# Altium footprint library CMR_Connectors.PcbLib: 71 footprints (part 1 of 5)
Each footprint in its own frame and in the unit in brackets; x right, y up, seen from the top. Pads: shape width x height; smd on the part's side, far side on the other; paste and mask are expansions set on the pad; w line width, h text height; cw(c..) or ccw(c..) is an arc to the next point about the centre after c.
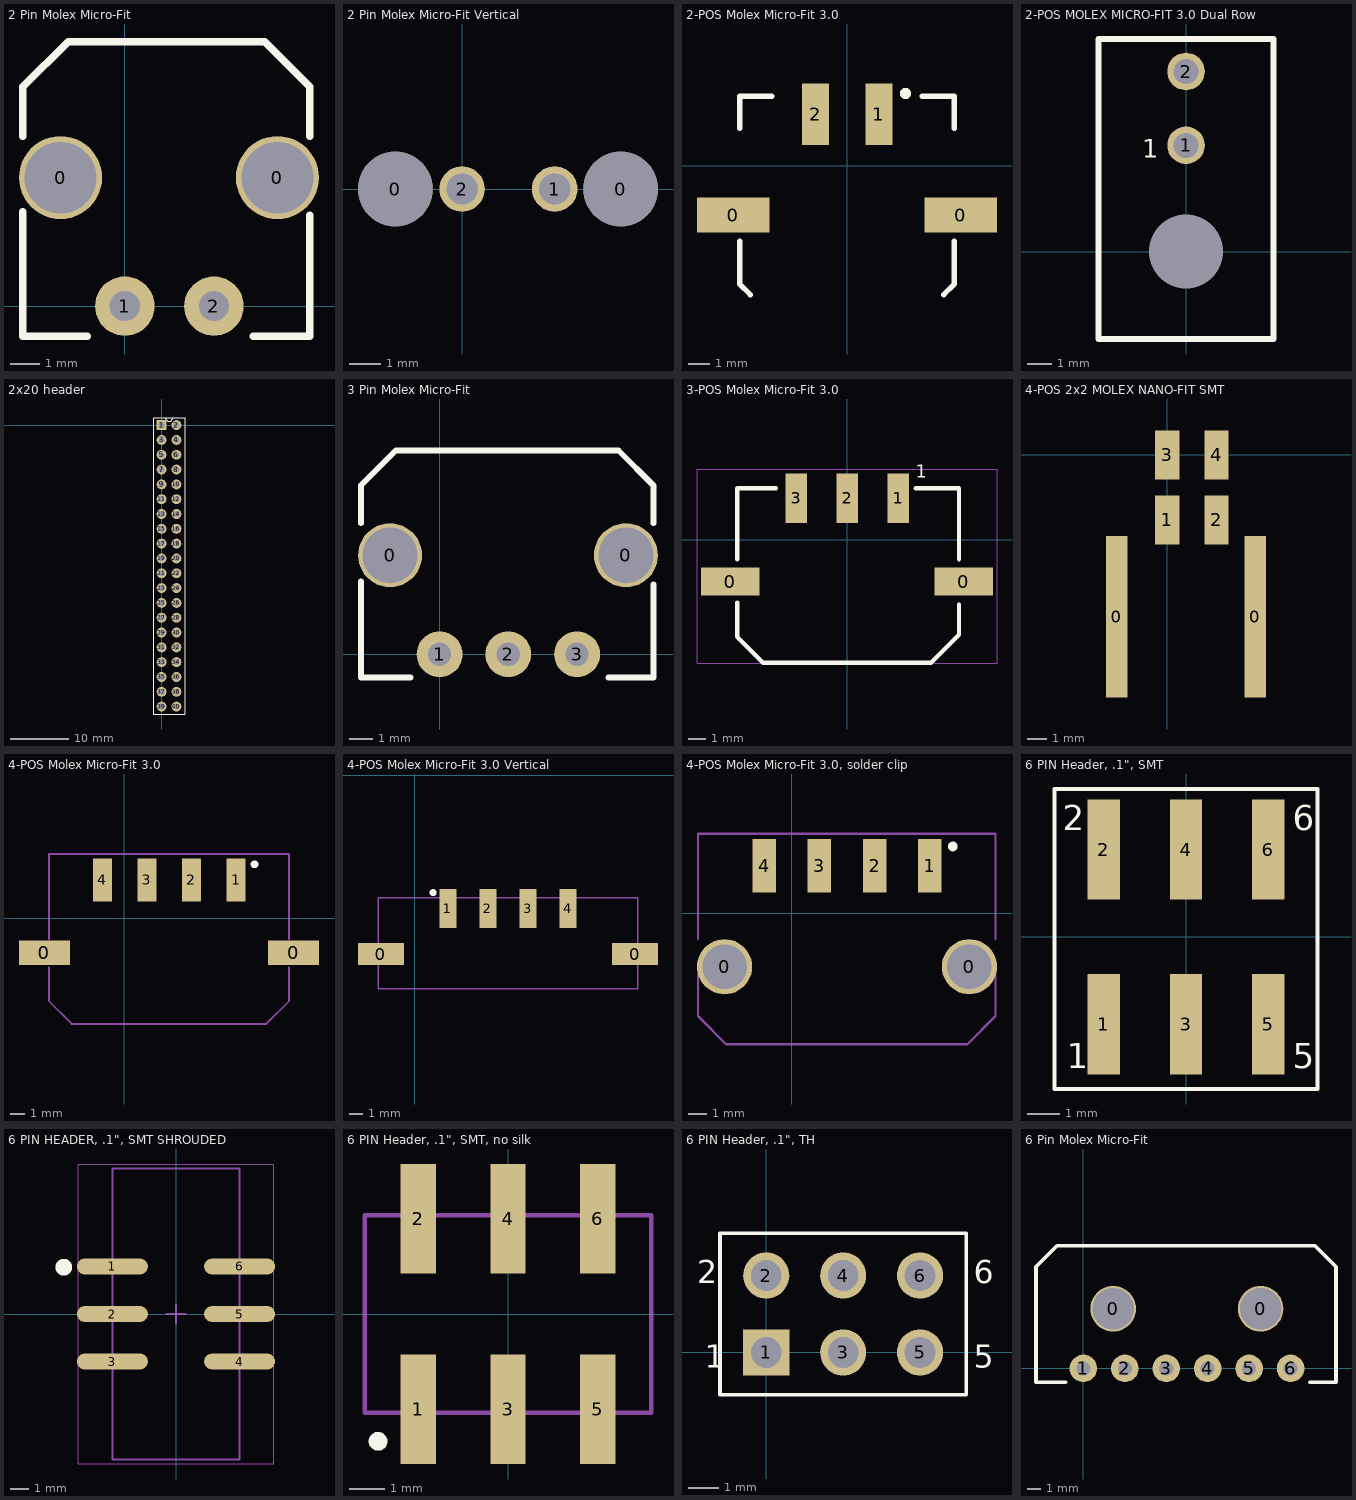
[diagram p0: the footprints below, top view; thin cyan lines are the x and y axes]

## 2 Pin Molex Micro-Fit [mil] "2 Pin Molex Micro-Fit"
pads (4):
  round 110 hole 95: 0(-85,170) 0(202,170)
  round 78.74 hole 40: 1(0,0) 2(118,0)
Top Overlay:
  lines w10: -135,125 -135,-40 -50,-40 ; -135,225 -135,290 -75,350 185,350 245,290 245,225 ; 170,-40 245,-40 245,120
3D body "436500203.stp": height 218.43, standoff -127.44, extent -132.96,-38.88 246.96,350.88
3D body "436450200.stp": height 274.02, standoff -8.66, extent -106.1,357.28 220.28,908.46

## 2 Pin Molex Micro-Fit Vertical [mil] "2 Pin Molex Micro-Fit Vertical"
pads (4):
  round 95 hole 95 unplated: 0(-85,0) 0(202,0)
  round 58 hole 40: 1(118,0) 2(0,0)
3D body "436500218.stp": height 389.88, standoff -125.08, extent -130.95,-96.24 248.97,124.43
3D body "436450200.stp": height 942.91, standoff 391.73, extent -104.19,-103 222.19,176.53

## 2-POS Molex Micro-Fit 3.0 [mil] "2-POS SMT HEADER, Molex Micro-Fit 3.0"
height 345
pads (4):
  rect 135x65 smd mask+3: 0(-212,-91.5) 0(212,-91.5)
  rect 50x115 smd mask+3: 1(59.5,96.5) 2(-58.5,96.5)
Top Overlay:
  circle w10: c109,135 r5.39
  lines w10: -200,-140 -200,-220 -180,-240 ; -200,70 -200,130 -140,130 ; 140,130 200,130 200,70 ; 180,-240 200,-220 200,-140
3D body "436450200.stp": height 275.59, standoff -3.94, extent -163.98,-831.69 162.4,-280.51
3D body "436500212.stp": height 223.43, standoff 0, extent -268.69,-274.88 268.71,147.96

## 2-POS MOLEX MICRO-FIT 3.0 Dual Row [mil] "2-POS TH Dual Row HEADER, Molex Micro-Fit 3.0"
height 345
pads (3):
  round 0 hole 118 unplated: 0(0,0)
  round 60 hole 40: 1(0,170) 2(0,288)
Top Overlay:
  lines w10: -140,-140 140,-140 140,340 -140,340 -140,-140
  text "1" at -70,150 h30
3D body "430250200.stp": height 421.65, standoff -5.51, extent -104.92,-733.27 102.95,-182.09
3D body "430450200.stp": height 346.35, standoff -124.12, extent -140.75,-179.88 140.75,302.01

## 2x20 header [mm]
pads (40):
  rect 1.7x1.7 hole 1.02: 1(0,0)
  round 1.7 hole 1.02: 2(2.54,0) 3(0,-2.54) 4(2.54,-2.54) 5(0,-5.08) 6(2.54,-5.08) 7(0,-7.62) 8(2.54,-7.62) 9(0,-10.16) 10(2.54,-10.16) 11(0,-12.7) 12(2.54,-12.7) 13(0,-15.24) 14(2.54,-15.24) 15(0,-17.78) 16(2.54,-17.78) 17(0,-20.32) 18(2.54,-20.32) 19(0,-22.86) 20(2.54,-22.86) 21(0,-25.4) 22(2.54,-25.4) 23(0,-27.94) 24(2.54,-27.94) 25(0,-30.48) 26(2.54,-30.48) 27(0,-33.02) 28(2.54,-33.02) 29(0,-35.56) 30(2.54,-35.56) 31(0,-38.1) 32(2.54,-38.1) 33(0,-40.64) 34(2.54,-40.64) 35(0,-43.18) 36(2.54,-43.18) 37(0,-45.72) 38(2.54,-45.72) 39(0,-48.26) 40(2.54,-48.26)
Top Overlay:
  lines w0.2: -1.4,-49.53 -1.4,1.27 1.905,1.27 cw(c1.27,1.27) 0.635,1.27 3.925,1.27 3.925,-49.53 -1.4,-49.53

## 3 Pin Molex Micro-Fit [mil] "3 Pin Molex Micro-Fit"
pads (5):
  round 110 hole 95: 0(-85,170) 0(320,170)
  round 78.74 hole 40: 1(0,0) 2(118,0) 3(236.11,0)
Top Overlay:
  lines w10: -135,125 -135,-40 -50,-40 ; -135,225 -135,290 -75,350 307.05,350 367.05,290 367.05,225 ; 290,-40 365,-40 ; 367.05,-40 367.05,120
3D body "436450300.stp": height 274.02, standoff -9.84, extent -74.8,354.33 312.99,905.51
3D body "436500305.stp": height 218.43, standoff -127.44, extent -130.01,-40.88 368.02,348.88

## 3-POS Molex Micro-Fit 3.0 [mil] "3-POS SMT HEADER, Molex Micro-Fit 3.0"
height 345
pads (5):
  rect 135x65 smd mask+3: 0(-271.06,-96.5) 0(271.06,-96.5)
  rect 50x115 smd mask+3: 1(118.56,96.5) 2(0.44,96.5) 3(-117.56,96.5)
Top Overlay:
  lines w10: -255,-145 -255,-225 -195,-285 195,-285 260,-220 260,-150 ; -255,-45 -255,120 -165,120 ; 160,120 260,120 260,-45
  text "1" at 160,145 h30
Mechanical 15:
  lines w1.97: -348.43,-286.5 348.43,-286.5 348.43,-16.81 348.43,164.29 -124.02,164.29 -348.43,164.29 -348.43,-286.5
3D body "436450300.stp": height 275.59, standoff -3.94, extent -191.93,-837.68 195.87,-286.5
3D body "436500312.stp": height 223.43, standoff 0, extent -327.57,-276.42 327.95,146.42

## 4-POS 2x2 MOLEX NANO-FIT SMT [mm]
pads (6):
  rect 1.1x8.2 smd: 0(-2.57,-8.23) 0(4.47,-8.23)
  rect 1.24x2.5 smd: 1(0,-3.3) 2(2.5,-3.3) 3(0,0) 4(2.5,0)
3D body "1053081204.stp": height 10.01, standoff -0.45, extent -2.75,-29.875 4.95,-14.175
3D body "1054051304.stp": height 9.5, standoff 0.01, extent -3.42,-13.875 5.32,0.865

## 4-POS Molex Micro-Fit 3.0 [mil] "4-POS SMT HEADER, Molex Micro-Fit 3.0"
height 345
pads (6):
  rect 135x65 smd mask+3: 0(-212,-91.5) 0(448.22,-91.5)
  rect 50x115 smd mask+3: 1(295.72,101.5) 2(177.61,101.5) 3(59.5,101.5) 4(-58.5,101.5)
Top Overlay:
  circle w10: c345,143 r5.39
Mechanical 1:
  lines w5: -200,-130 -200,-220 -140,-280 376,-280 ; -200,-55 -200,170 436.22,170 436.22,-55 ; 376.22,-280 436.22,-220 436.22,-130
3D body "436500412.stp": height 223.43, standoff 0, extent -268.69,-273.62 504.93,149.22
3D body "436450400.stp": height 274.02, standoff -9.84, extent -134.84,-826.77 371.06,-275.59

## 4-POS Molex Micro-Fit 3.0 Vertical [mil] "4-POS SMT HEADER, Molex Micro-Fit 3.0 Vertical"
height 345
pads (6):
  rect 135x65 smd mask+3: 0(-100.12,-525.98) 0(647.91,-525.98)
  rect 50x115 smd mask+3: 1(96.73,-392.13) 2(214.84,-392.13) 3(332.95,-392.13) 4(451.06,-392.13)
Top Overlay:
  circle w10: c53.43,-344.88 r5.39
Mechanical 1:
  lines w5: -107.99,-628.35 655.79,-628.35 655.79,-359.92 -107.99,-359.92 -107.99,-628.35
3D body "436450400.stp": height 931.1, standoff 379.92, extent 19.68,-630.31 525.59,-346.46
3D body "436500424.stp": height 391.73, standoff 0.79, extent -112.91,-623.22 660.71,-364.56

## 4-POS Molex Micro-Fit 3.0, solder clip [mil] "4-POS SMT HEADER, Molex Micro-Fit 3.0, solder clip"
height 345
pads (6):
  round 118.11 hole 94.88: 0(-143.15,-114.37) 0(380.35,-114.37)
  rect 50x115 smd mask+3: 1(295.72,101.5) 2(177.61,101.5) 3(59.5,101.5) 4(-58.5,101.5)
Top Overlay:
  circle w10: c345,143 r5.39
Mechanical 1:
  lines w5: -200,-130 -200,-220 -140,-280 376,-280 ; -200,-55 -200,170 436.22,170 436.22,-55 ; 376.22,-280 436.22,-220 436.22,-130
3D body "436500410.stp": height 221.85, standoff -77.56, extent -187.99,-287.4 428.16,135.44
3D body "436450400.stp": height 277.95, standoff -5.91, extent -132.87,-875.98 373.03,-324.8

## 6 PIN Header, .1", SMT [mm] "3x2 .1\" SMT Header"
height 9.6
pads (6):
  rect 1x3.1 smd: 1(-2.54,-2.7) 2(-2.54,2.7) 3(0,-2.7) 4(0,2.7) 5(2.54,-2.7) 6(2.54,2.7)
Top Overlay:
  lines w0.127: -4.064,-4.699 4.064,-4.699 4.064,4.572 -4.064,4.572 -4.064,-4.699
  text "5" at 3.302,-4.064 h0.76
  text "6" at 3.302,3.302 h0.76
  text "2" at -3.81,3.302 h0.76
  text "1" at -3.683,-4.064 h0.76
3D body "61000621121.stp": height 9.61, standoff 0.01, extent -3.81,-3.75 3.81,3.75

## 6 PIN HEADER, .1", SMT SHROUDED [mm]
height 9
pads (6):
  oval 3.8x0.85 smd: 1(-3.4,2.54) 2(-3.4,0) 3(-3.4,-2.54) 4(3.4,-2.54) 5(3.4,0) 6(3.4,2.54)
Top Overlay:
  circle w0.8: c-6,2.5 r0.05
Mechanical 13:
  lines w0.1: -3.4,-7.77 -3.4,7.77 3.4,7.77 3.4,-7.77 -3.4,-7.77
Mechanical 15:
  lines w0.05: -5.22,-8.02 -5.22,8.02 5.22,8.02 5.22,-8.02 -5.22,-8.02
  lines w0.1: -0.5,0 0.5,0 ; 0,-0.5 0,0.5
3D body: height 9, standoff 0, extent -4.5,-7.77 4.5,7.77

## 6 PIN Header, .1", SMT, no silk [mm] "w/out silkscreen box"
height 9.6
pads (6):
  rect 1x3.1 smd: 1(-2.54,-2.7) 2(-2.54,2.7) 3(0,-2.7) 4(0,2.7) 5(2.54,-2.7) 6(2.54,2.7)
Top Overlay:
  circle w0.254: c-3.683,-3.607 r0.137
Mechanical 1:
  lines w0.127: -4.064,-2.794 4.064,-2.794 4.064,2.794 -4.064,2.794 -4.064,-2.794
3D body "61000621121.stp": height 9.61, standoff 0.01, extent -3.81,-3.75 3.81,3.75

## 6 PIN Header, .1", TH [mil] "3x2 .1\" TH Header"
height 338
pads (6):
  rect 60x60 hole 40: 1(0,0)
  round 60 hole 40: 2(0,100) 3(100,0) 4(100,100) 5(200,0) 6(200,100)
Top Overlay:
  lines w5: -60,-55 260,-55 260,155 -60,155 -60,-55
  text "5" at 270,-20 h30
  text "6" at 270,90 h30
  text "2" at -90,90 h30
  text "1" at -80,-20 h30
3D body "67996-x06.STEP": height 297, standoff -128, extent -50,-45 250,145

## 6 Pin Molex Micro-Fit [mm] "6 Pin Molex Micro-Fit"
pads (8):
  round 3.302 hole 2.997: 0(2.159,4.318) 0(12.827,4.318)
  round 2 hole 1.016: 1(0,0) 2(3,0) 3(6,0) 4(9,0) 5(12,0) 6(15,0)
Top Overlay:
  lines w0.254: -1.27,-1.016 -3.429,-1.016 -3.429,3.175 -3.429,5.715 -3.429,7.366 -1.905,8.89 4.699,8.89 16.764,8.89 18.288,7.366 18.288,5.715 18.288,3.048 18.288,-1.016 16.383,-1.016
3D body "436500600.stp": height 5.55, standoff -3.36, extent -3.327,-1.013 18.313,8.887
3D body "436450600.stp": height 6.96, standoff -0.25, extent -1.925,9.05 16.925,23.05